# Altium footprint library NFC-Reader.PcbLib: 67 footprints (part 3 of 5)
Each footprint in its own frame and in the unit in brackets; x right, y up, seen from the top. Pads: shape width x height; smd on the part's side, far side on the other; paste and mask are expansions set on the pad; w line width, h text height; cw(c..) or ccw(c..) is an arc to the next point about the centre after c.
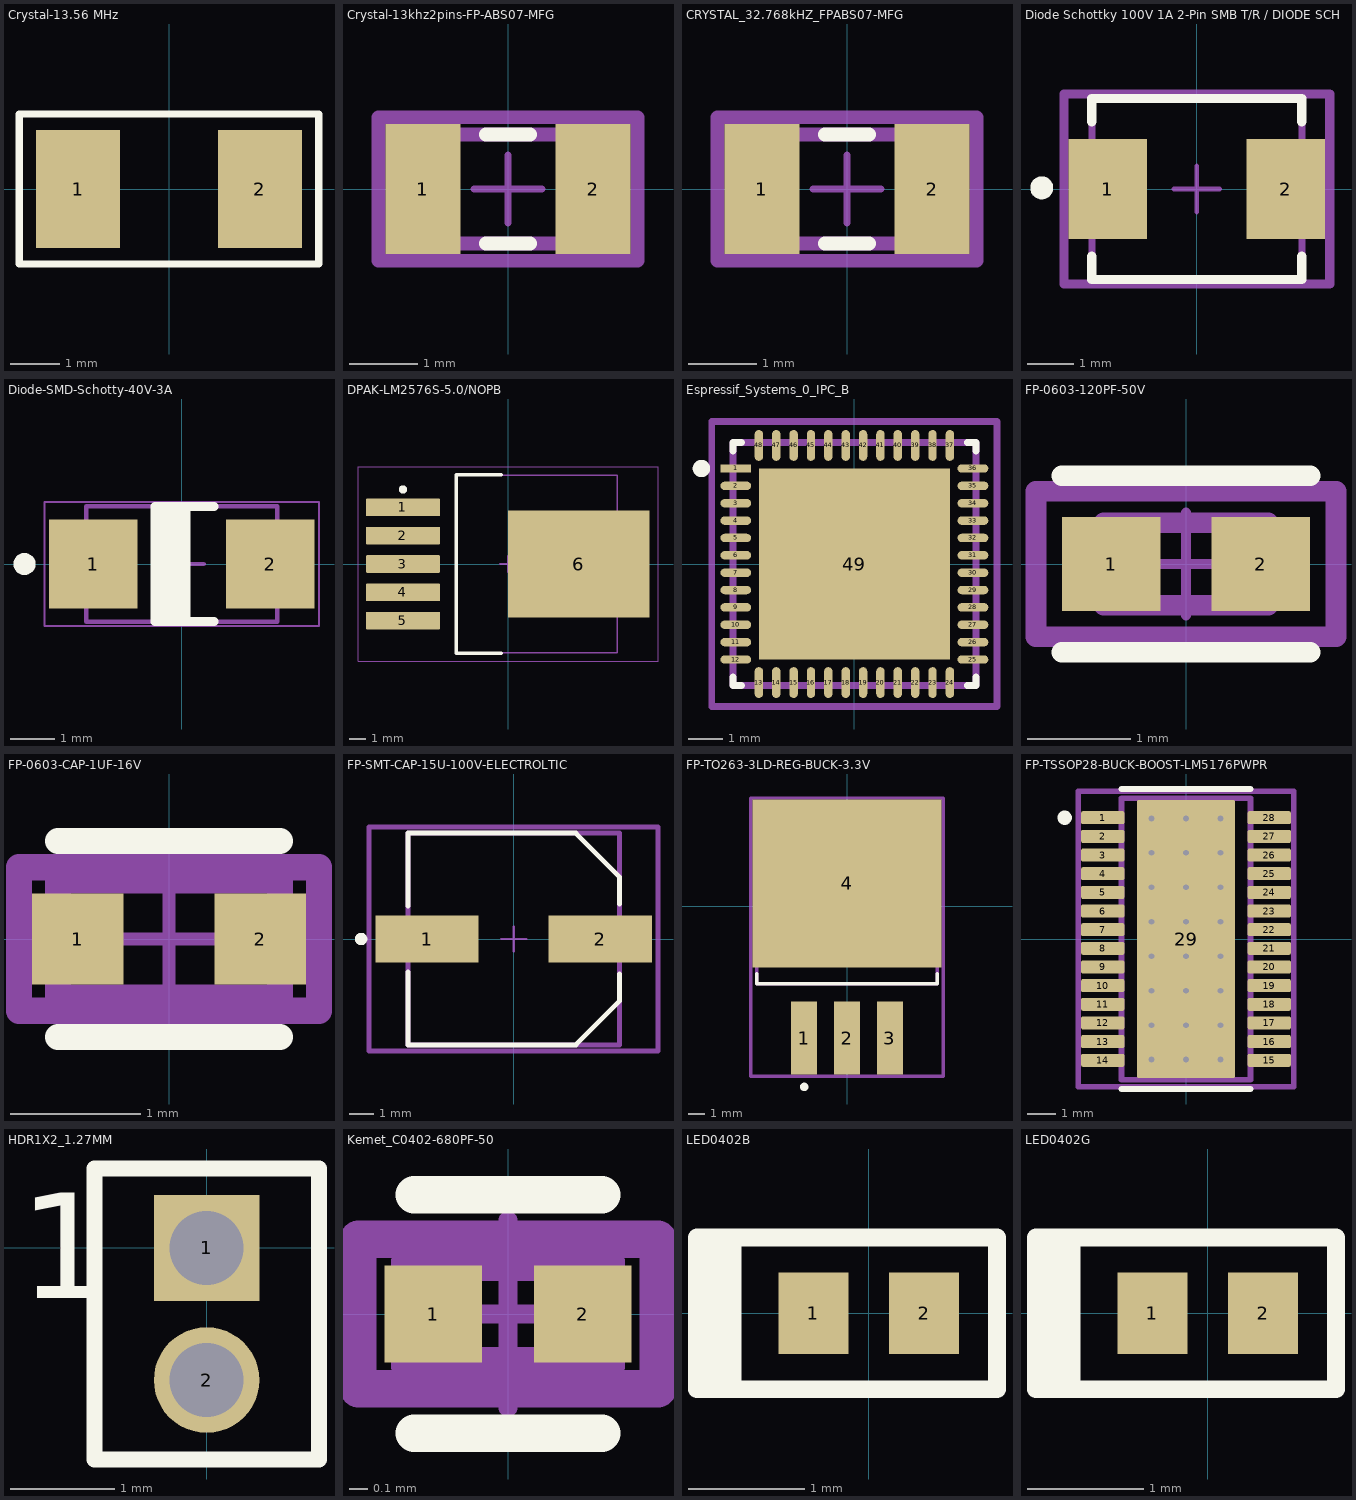
[diagram p2: the footprints below, top view; thin cyan lines are the x and y axes]

## Crystal-13.56 MHz [mm]
pads (2):
  rect 1.7x2.4 smd: 1(-1.85,0) 2(1.85,0)
Top Overlay:
  lines w0.15: -3.048,-1.524 3.048,-1.524 3.048,1.524 -3.048,1.524 -3.048,-1.524
3D body "ABM7-12.000MHZ-D2Y-T.STEP": height 1.41, standoff 0.01, extent -3,-1.75 3,1.75

## Crystal-13khz2pins-FP-ABS07-MFG [mm]
pads (2):
  rect 1.1x1.9 smd paste+0 mask+0: 1(-1.25,0) 2(1.25,0)
Top Overlay:
  lines w0.2: -0.325,-0.8 0.325,-0.8 ; -0.325,0.8 0.325,0.8
Top Assembly:
  lines w0.2: -1.9,-1.05 -1.9,1.05 1.9,1.05 1.9,-1.05 -1.9,-1.05
  text ".Designator" at 0,0.188 h1
Top 3D Body:
  lines w0.2: -1.65,-0.8 -1.65,0.8 1.65,0.8 1.65,-0.8 -1.65,-0.8
Top Courtyard:
  lines w0.2: -1.9,-1.05 -1.9,1.05 1.9,1.05 1.9,-1.05 -1.9,-1.05
Top Component Center:
  lines w0.1: -0.5,0 0.5,0 ; 0,-0.5 0,0.5
3D body "Crys_Abracon_ABS07-166-32_768KHZ-T_eec.STEP": height 0.25, standoff 0, extent -1.9,-1.05 1.9,1.05

## CRYSTAL_32.768kHZ_FPABS07-MFG [mm]
pads (2):
  rect 1.1x1.9 smd paste+0 mask+0: 1(-1.25,0) 2(1.25,0)
Top Overlay:
  lines w0.2: -0.325,-0.8 0.325,-0.8 ; -0.325,0.8 0.325,0.8
Top Assembly:
  lines w0.2: -1.9,-1.05 -1.9,1.05 1.9,1.05 1.9,-1.05 -1.9,-1.05
  text ".Designator" at 0,0.188 h1
Top 3D Body:
  lines w0.2: -1.65,-0.8 -1.65,0.8 1.65,0.8 1.65,-0.8 -1.65,-0.8
Top Courtyard:
  lines w0.2: -1.9,-1.05 -1.9,1.05 1.9,1.05 1.9,-1.05 -1.9,-1.05
Top Component Center:
  lines w0.1: -0.5,0 0.5,0 ; 0,-0.5 0,0.5
3D body "Crys_Abracon_ABS07-166-32_768KHZ-T_eec.STEP": height 0.25, standoff 0, extent -1.9,-1.05 1.9,1.05

## Diode Schottky 100V 1A 2-Pin SMB T/R / DIODE SCHOTTK [mil]
pads (2):
  rect 67.5x86 smd paste+0 mask+0: 1(-76.25,0) 2(76.25,0)
Top Overlay:
  circle w9.84: c-132.87,0.98 r4.92
  lines w7.87: -89.96,-57.68 -89.96,-77.56 89.96,-77.56 89.96,-57.68 ; -89.96,57.68 -89.96,77.56 89.96,77.56 89.96,57.68
Mechanical 10:
  lines w7.87: -113.94,-81.5 113.94,-81.5 113.94,81.5 -113.94,81.5 -113.94,-81.5
  text ".Designator" at 0,0 h39.37
Mechanical 12:
  lines w5.91: -89.96,-77.56 89.96,-77.56 89.96,77.56 -89.96,77.56 -89.96,-77.56
Top Courtyard:
  lines w3.94: -19.68,0 19.68,0 ; 0,-19.68 0,19.68
  lines w7.87: -113.94,-81.5 113.94,-81.5 113.94,81.5 -113.94,81.5 -113.94,-81.5
3D body "Diode_Vishay_VS-10BQ100-M3-5BT_eec.STEP": height 10, standoff 0, extent -113.94,-81.5 113.94,81.5

## Diode-SMD-Schotty-40V-3A [mm] "Molded, 2-Leads, Body 4.32x2.6mm"
height 2.2
pads (2):
  rect 2x2 smd: 1(-2,0) 2(2,0)
Top Overlay:
  circle w0.25: c-3.55,0 r0.125
  rectangle: -0.578,-1.3 0.2,1.3
  lines w0.2: 0.736,-1.3 -0.6,-1.3 -0.6,1.3 ; 0.736,1.3 -0.6,1.3 ; -0.6,1.3 -0.6,1.3
Top 3D Body:
  lines w0.1: -2.16,-1.3 -2.16,1.3 2.16,1.3 2.16,-1.3 -2.16,-1.3
Top Courtyard:
  lines w0.05: -3.1,-1.4 3.1,-1.4 3.1,1.4 -3.1,1.4 -3.1,-1.4
  lines w0.1: -0.5,0 0.5,0 ; 0,-0.5 0,0.5
3D body: height 2.2, standoff 0.05, extent -2.16,-1.3 2.16,1.3

## DPAK-LM2576S-5.0/NOPB [mm] "DPAK, 5-Leads, Body 10.65x9.65mm, Pitch 1.7mm, IPC Low Density"
height 4.83
pads (6):
  rrect10% 4.45x1.05 smd: 1(-6.3,3.4) 2(-6.3,1.7) 3(-6.3,0) 4(-6.3,-1.7) 5(-6.3,-3.4)
  rrect2% 8.5x6.45 smd: 6(4.25,0)
Top Overlay:
  circle w0.25: c-6.3,4.475 r0.125
  lines w0.2: -0.4,-5.35 -3.1,-5.35 -3.1,5.35 -0.4,5.35
Mechanical 1:
  text ".Designator" at -1.905,-0.635 h1.3
Top 3D Body:
  lines w0.1: -3.1,-5.325 -3.1,5.325 6.55,5.325 6.55,-5.325 -3.1,-5.325
Top Courtyard:
  lines w0.05: -9,-5.825 -9,5.825 9,5.825 9,-5.825 -9,-5.825
  lines w0.1: -0.5,0 0.5,0 ; 0,-0.5 0,0.5
3D body: height 4.83, standoff 0, extent -3.1,-5.325 6.55,5.325

## Espressif_Systems_0_IPC_B [mm]
pads (49):
  rect 0.885x0.242 smd paste+0 mask+0: 1(-3.413,2.75)
  rrect100% 0.885x0.242 smd paste+0 mask+0: 2(-3.413,2.25) 3(-3.413,1.75) 4(-3.413,1.25) 5(-3.413,0.75) 6(-3.413,0.25) 7(-3.413,-0.25) 8(-3.413,-0.75) 9(-3.413,-1.25) 10(-3.413,-1.75) 11(-3.413,-2.25) 12(-3.413,-2.75) 25(3.413,-2.75) 26(3.413,-2.25) 27(3.413,-1.75) 28(3.413,-1.25) 29(3.413,-0.75) 30(3.413,-0.25) 31(3.413,0.25) 32(3.413,0.75) 33(3.413,1.25) 34(3.413,1.75) 35(3.413,2.25) 36(3.413,2.75)
  rrect100% 0.242x0.885 smd paste+0 mask+0: 13(-2.75,-3.413) 14(-2.25,-3.413) 15(-1.75,-3.413) 16(-1.25,-3.413) 17(-0.75,-3.413) 18(-0.25,-3.413) 19(0.25,-3.413) 20(0.75,-3.413) 21(1.25,-3.413) 22(1.75,-3.413) 23(2.25,-3.413) 24(2.75,-3.413) 37(2.75,3.413) 38(2.25,3.413) 39(1.75,3.413) 40(1.25,3.413) 41(0.75,3.413) 42(0.25,3.413) 43(-0.25,3.413) 44(-0.75,3.413) 45(-1.25,3.413) 46(-1.75,3.413) 47(-2.25,3.413) 48(-2.75,3.413)
  rect 5.5x5.5 smd paste-1000 mask+0: 49(0,0)
Top Overlay:
  circle w0.25: c-4.406,2.75 r0.125
  lines w0.2: -3.5,-3.25 -3.5,-3.5 -3.25,-3.5 ; -3.5,3.25 -3.5,3.5 -3.25,3.5 ; 3.25,-3.5 3.5,-3.5 3.5,-3.25 ; 3.25,3.5 3.5,3.5 3.5,3.25
Top Paste:
  rectangle: -2.076,0.337 -0.337,2.076
  rectangle: 0.337,0.337 2.076,2.076
  rectangle: -2.076,-2.076 -0.337,-0.337
  rectangle: 0.337,-2.076 2.076,-0.337
Mechanical 10:
  lines w0.2: -4.106,-4.106 4.106,-4.106 4.106,4.106 -4.106,4.106 -4.106,-4.106
  text ".Designator" at 0,-0.001 h1
Mechanical 12:
  lines w0.2: -3.5,-3.5 3.5,-3.5 3.5,3.5 -3.5,3.5 -3.5,-3.5
Top Courtyard:
  lines w0.1: -0.5,0 0.5,0 ; 0,-0.5 0,0.5
  lines w0.2: -4.106,-4.106 4.106,-4.106 4.106,4.106 -4.106,4.106 -4.106,-4.106
3D body "IC_Espressif_Systems_ESP32-PICO-D4_eec.STEP": height 0.25, standoff 0, extent -4.106,-4.106 4.106,4.106

## FP-0603-120PF-50V [mm]
pads (2):
  rect 0.958x0.912 smd paste+0 mask+0: 1(-0.727,0) 2(0.727,0)
Top Overlay:
  lines w0.2: -1.206,-0.856 1.206,-0.856 ; -1.206,0.856 1.206,0.856
Top Assembly:
  lines w0.2: -1.456,-0.706 1.456,-0.706 1.456,0.706 -1.456,0.706 -1.456,-0.706
  text ".Designator" at 0,0.188 h1
Top 3D Body:
  lines w0.2: -0.8,-0.4 0.8,-0.4 0.8,0.4 -0.8,0.4 -0.8,-0.4
Top Courtyard:
  lines w0.2: -1.456,-0.706 1.456,-0.706 1.456,0.706 -1.456,0.706 -1.456,-0.706
Top Component Center:
  lines w0.1: -0.5,0 0.5,0 ; 0,-0.5 0,0.5
3D body "Cap_Samsung_CL10B473KO8NNWC_eec.STEP": height 0.25, standoff 0, extent -1.456,-0.706 1.456,0.706

## FP-0603-CAP-1UF-16V [mm]
pads (2):
  rect 0.7x0.7 smd paste+0 mask+0: 1(-0.7,0) 2(0.7,0)
Top Overlay:
  lines w0.2: -0.85,-0.75 0.85,-0.75 ; -0.85,0.75 0.85,0.75
Top Assembly:
  lines w0.2: -1.15,-0.55 -1.15,0.55 1.15,0.55 1.15,-0.55 -1.15,-0.55
  text ".Designator" at 0,0.188 h1
Top 3D Body:
  lines w0.2: -0.85,-0.45 -0.85,0.45 0.85,0.45 0.85,-0.45 -0.85,-0.45
Top Courtyard:
  lines w0.2: -1.15,-0.55 -1.15,0.55 1.15,0.55 1.15,-0.55 -1.15,-0.55
Top Component Center:
  lines w0.1: -0.5,0 0.5,0 ; 0,-0.5 0,0.5
3D body "Cap_Taiyo_Yuden_LMK107SD223KA-T_eec.STEP": height 0.25, standoff 0, extent -1.15,-0.55 1.15,0.55

## FP-SMT-CAP-15U-100V-ELECTROLTIC [mm]
pads (2):
  rect 4.15x1.9 smd paste+0 mask+0: 1(-3.475,0) 2(3.475,0)
Top Overlay:
  circle w0.25: c-6.125,0 r0.125
  lines w0.2: -4.25,-1.325 -4.25,-4.25 2.5,-4.25 4.25,-2.5 4.25,-1.4 ; -4.25,1.325 -4.25,4.25 2.5,4.25 4.25,2.5 4.25,1.4
Top Assembly:
  lines w0.2: -5.8,-4.5 -5.8,4.5 5.8,4.5 5.8,-4.5 -5.8,-4.5
  text ".Designator" at 0,0.188 h1
Top 3D Body:
  lines w0.2: -4.25,-4.25 -4.25,4.25 4.25,4.25 4.25,-4.25 -4.25,-4.25
Top Courtyard:
  lines w0.2: -5.8,-4.5 -5.8,4.5 5.8,4.5 5.8,-4.5 -5.8,-4.5
Top Component Center:
  lines w0.1: -0.5,0 0.5,0 ; 0,-0.5 0,0.5
3D body "Cap_Panasonic_20SVP100M_eec.STEP": height 0.25, standoff 0, extent -5.8,-4.5 5.8,4.5

## FP-TO263-3LD-REG-BUCK-3.3V [mil]
pads (4):
  rect 60x170 smd paste+0 mask+0: 1(-100,-306.75) 2(0,-306.75) 3(100,-306.75)
  rect 440x390 smd paste+0 mask+0: 4(0,53.25)
Top Overlay:
  circle w9.84: c-99.76,-420.29 r4.92
  lines w7.87: -210,-156.52 -210,-180.5 210,-180.5 210,-156.52
Top Assembly:
  lines w7.87: -223.94,-395.69 -223.94,252.19 223.94,252.19 223.94,-395.69 -223.94,-395.69
  text ".Designator" at 0,-71.77 h39.37
Top 3D Body:
  lines w7.87: -210,-180.5 -210,180.5 210,180.5 210,-180.5 -210,-180.5
Top Courtyard:
  lines w7.87: -223.94,-395.69 -223.94,252.19 223.94,252.19 223.94,-395.69 -223.94,-395.69
Top Component Center:
  lines w3.94: -19.68,0 19.68,0 ; 0,-19.68 0,19.68
3D body "IC_Microchip_MIC29150-5_0WU_eec.STEP": height 10, standoff 0, extent -223.94,-395.69 223.94,252.19

## FP-TSSOP28-BUCK-BOOST-LM5176PWPR [mm]
pads (29):
  rrect22% 1.5x0.45 smd paste+0 mask+0: 1(-2.9,4.225) 2(-2.9,3.575) 3(-2.9,2.925) 4(-2.9,2.275) 5(-2.9,1.625) 6(-2.9,0.975) 7(-2.9,0.325) 8(-2.9,-0.325) 9(-2.9,-0.975) 10(-2.9,-1.625) 11(-2.9,-2.275) 12(-2.9,-2.925) 13(-2.9,-3.575) 14(-2.9,-4.225) 15(2.9,-4.225) 16(2.9,-3.575) 17(2.9,-2.925) 18(2.9,-2.275) 19(2.9,-1.625) 20(2.9,-0.975) 21(2.9,-0.325) 22(2.9,0.325) 23(2.9,0.975) 24(2.9,1.625) 25(2.9,2.275) 26(2.9,2.925) 27(2.9,3.575) 28(2.9,4.225)
  rrect3% 3.4x9.7 smd paste-1000 mask-1000: 29(0,0)
via 0,-4.2 diameter 0.5 hole 0.2
via 0,-3 diameter 0.5 hole 0.2
via 0,-1.8 diameter 0.5 hole 0.2
via 0,-0.6 diameter 0.5 hole 0.2
via 0,0.6 diameter 0.5 hole 0.2
via 0,1.8 diameter 0.5 hole 0.2
via 0,3 diameter 0.5 hole 0.2
via 0,4.2 diameter 0.5 hole 0.2
via 1.2,-4.2 diameter 0.5 hole 0.2
via 1.2,-3 diameter 0.5 hole 0.2
via 1.2,-1.8 diameter 0.5 hole 0.2
via 1.2,-0.6 diameter 0.5 hole 0.2
via 1.2,0.6 diameter 0.5 hole 0.2
via 1.2,1.8 diameter 0.5 hole 0.2
via 1.2,3 diameter 0.5 hole 0.2
via 1.2,4.2 diameter 0.5 hole 0.2
via -1.2,-4.2 diameter 0.5 hole 0.2
via -1.2,-3 diameter 0.5 hole 0.2
via -1.2,-1.8 diameter 0.5 hole 0.2
via -1.2,-0.6 diameter 0.5 hole 0.2
via -1.2,0.6 diameter 0.5 hole 0.2
via -1.2,1.8 diameter 0.5 hole 0.2
via -1.2,3 diameter 0.5 hole 0.2
via -1.2,4.2 diameter 0.5 hole 0.2
Top Overlay:
  circle w0.25: c-4.225,4.225 r0.125
  lines w0.2: -2.25,-5.225 2.25,-5.225 ; -2.25,5.225 2.25,5.225
Top Paste:
  region: -1.55,-2.54 -1.55,2.54 -1.55,2.55 -1.542,2.568 -1.528,2.582 -1.51,2.59 -1.5,2.59 1.5,2.59 1.51,2.59 1.528,2.582 1.542,2.568 1.55,2.55 1.55,2.54 1.55,-2.54 1.55,-2.55 1.542,-2.568 1.528,-2.582 1.51,-2.59 1.5,-2.59 -1.5,-2.59 -1.51,-2.59 -1.528,-2.582 -1.542,-2.568 -1.55,-2.55
Top Solder:
  region: -1.55,-2.54 -1.55,2.54 -1.55,2.55 -1.542,2.568 -1.528,2.582 -1.51,2.59 -1.5,2.59 1.5,2.59 1.51,2.59 1.528,2.582 1.542,2.568 1.55,2.55 1.55,2.54 1.55,-2.54 1.55,-2.55 1.542,-2.568 1.528,-2.582 1.51,-2.59 1.5,-2.59 -1.5,-2.59 -1.51,-2.59 -1.528,-2.582 -1.542,-2.568 -1.55,-2.55
Top Assembly:
  lines w0.2: -3.75,-5.15 -3.75,5.15 3.75,5.15 3.75,-5.15 -3.75,-5.15
  text ".Designator" at 0,0.188 h1
Top 3D Body:
  lines w0.2: -2.25,-4.9 -2.25,4.9 2.25,4.9 2.25,-4.9 -2.25,-4.9
Top Courtyard:
  lines w0.2: -3.75,-5.15 -3.75,5.15 3.75,5.15 3.75,-5.15 -3.75,-5.15
Top Component Center:
  lines w0.1: -0.5,0 0.5,0 ; 0,-0.5 0,0.5
3D body "IC_Texas_Instruments_DRV8880PWPR_eec.STEP": height 0.25, standoff 0, extent -3.75,-5.15 3.75,5.15

## HDR1X2_1.27MM [mil]
pads (2):
  rect 40x40 hole 28: 1(0,0)
  round 40 hole 28: 2(0,-50)
Top Overlay:
  lines w6: -42.5,-80 42.5,-80 42.5,30 -42.5,30 -42.5,-80
  text "1" at -71,-19 h40
3D body "FTS-102-01-F-S.stp": height 159, standoff -85, extent -43.5,-75 41.5,25

## Kemet_C0402-680PF-50 [mm]
pads (2):
  rect 0.52x0.52 smd paste+0 mask+0: 1(-0.4,0) 2(0.4,0)
Top Overlay:
  lines w0.2: -0.5,-0.635 0.5,-0.635 ; -0.5,0.635 0.5,0.635
Mechanical 10:
  lines w0.2: -0.8,-0.4 0.8,-0.4 0.8,0.4 -0.8,0.4 -0.8,-0.4
  text ".Designator" at 0,0.188 h1
Mechanical 12:
  lines w0.2: -0.525,-0.275 0.525,-0.275 0.525,0.275 -0.525,0.275 -0.525,-0.275
Top Courtyard:
  lines w0.1: -0.5,0 0.5,0 ; 0,-0.5 0,0.5
  lines w0.2: -0.8,-0.4 0.8,-0.4 0.8,0.4 -0.8,0.4 -0.8,-0.4
3D body "Cap_Kemet_C0402C681K5RACTU_eec.STEP": height 0.25, standoff 0, extent -0.8,-0.4 0.8,0.4

## LED0402B [mm]
pads (2):
  rect 0.6x0.7 smd: 1(-0.475,0) 2(0.475,0)
Top Overlay:
  rectangle: -1.473,-0.66 -1.092,0.65
  lines w0.152: -1.473,-0.65 -1.473,0.65 1.1,0.65 1.1,-0.65 -1.473,-0.65
3D body "User Library-LED_1006_R.STEP": height 0.2, standoff 0, extent -0.5,-0.3 0.5,0.3

## LED0402G [mm]
pads (2):
  rect 0.6x0.7 smd: 1(-0.475,0) 2(0.475,0)
Top Overlay:
  rectangle: -1.473,-0.66 -1.092,0.65
  lines w0.152: -1.473,-0.65 1.1,-0.65 1.1,0.65 -1.473,0.65 -1.473,-0.65
3D body "User Library-LED_1006_G.STEP": height 0.2, standoff 0, extent -0.525,-0.295 0.475,0.305